# Altium footprint library TUNA_AL-CAP_Lib.PcbLib: 133 footprints (part 4 of 9)
Each footprint in its own frame and in the unit in brackets; x right, y up, seen from the top. Pads: shape width x height; smd on the part's side, far side on the other; paste and mask are expansions set on the pad; w line width, h text height; cw(c..) or ccw(c..) is an arc to the next point about the centre after c.
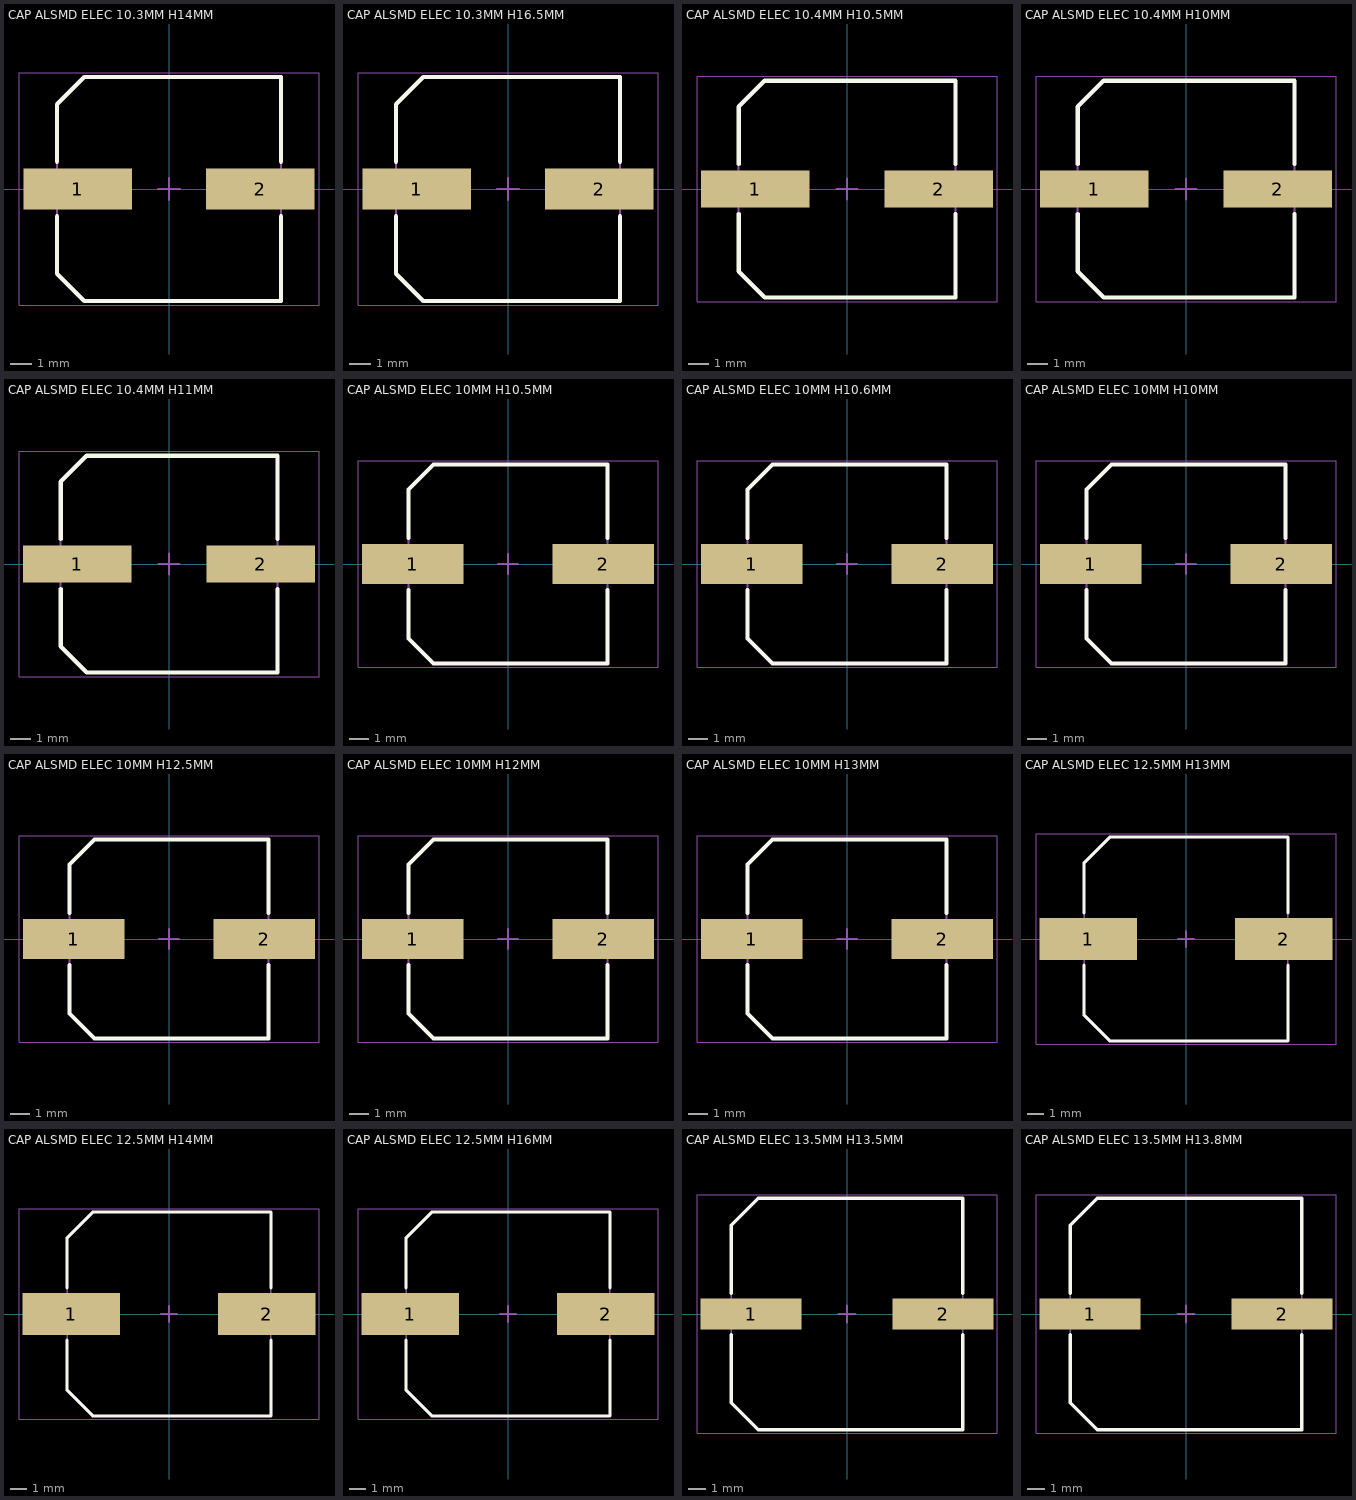
[diagram p3: the footprints below, top view; thin cyan lines are the x and y axes]

## CAP ALSMD ELEC 10.3MM H14MM [mm] "Aluminum SMD Electrolytic Capacitor, 10.30mm Land Size, 10.00mm Diameter, 14.00mm Height, 10.90mm Maximum Leads Span"
height 0.95
pads (2):
  rect 5x1.9 smd: 1(-4.2,0) 2(4.2,0)
Top Overlay:
  lines w0.2: -5.15,-1.25 -5.15,-3.9 -3.9,-5.15 5.15,-5.15 5.15,-1.25 ; -5.15,1.25 -5.15,3.9 -3.9,5.15 5.15,5.15 5.15,1.25
Mechanical 13:
  lines w0.1: -5.15,-3.9 -3.9,-5.15 5.15,-5.15 5.15,5.15 -3.9,5.15 -5.15,3.9 -5.15,-3.9
Mechanical 15:
  lines w0.05: -6.9,-5.35 6.9,-5.35 6.9,5.35 -6.9,5.35 -6.9,-5.35
  lines w0.1: -0.5,0 0.5,0 ; 0,-0.5 0,0.5
3D body ".STEP": height 14, standoff 0, extent -5.45,-5.15 5.45,5.15

## CAP ALSMD ELEC 10.3MM H16.5MM [mm] "Aluminum SMD Electrolytic Capacitor, 10.30mm Land Size, 10.00mm Diameter, 16.50mm Height, 10.90mm Maximum Leads Span"
height 0.95
pads (2):
  rect 5x1.9 smd: 1(-4.2,0) 2(4.2,0)
Top Overlay:
  lines w0.2: -5.15,-1.25 -5.15,-3.9 -3.9,-5.15 5.15,-5.15 5.15,-1.25 ; -5.15,1.25 -5.15,3.9 -3.9,5.15 5.15,5.15 5.15,1.25
Mechanical 13:
  lines w0.1: -5.15,-3.9 -5.15,3.9 -3.9,5.15 5.15,5.15 5.15,-5.15 -3.9,-5.15 -5.15,-3.9
Mechanical 15:
  lines w0.05: -6.9,-5.35 -6.9,5.35 6.9,5.35 6.9,-5.35 -6.9,-5.35
  lines w0.1: -0.5,0 0.5,0 ; 0,-0.5 0,0.5
3D body ".STEP": height 16.5, standoff 0, extent -5.45,-5.15 5.45,5.15

## CAP ALSMD ELEC 10.4MM H10.5MM [mm] "Aluminum SMD Electrolytic Capacitor, 10.40mm Land Size, 10.00mm Diameter, 10.50mm Height, 11.30mm Maximum Leads Span"
height 0.9
pads (2):
  rect 5.2x1.8 smd: 1(-4.4,0) 2(4.4,0)
Top Overlay:
  lines w0.2: -5.2,-1.2 -5.2,-3.95 -3.95,-5.2 5.2,-5.2 5.2,-1.2 ; -5.2,1.2 -5.2,3.95 -3.95,5.2 5.2,5.2 5.2,1.2
Mechanical 13:
  lines w0.1: -5.2,-3.95 -3.95,-5.2 5.2,-5.2 5.2,5.2 -3.95,5.2 -5.2,3.95 -5.2,-3.95
Mechanical 15:
  lines w0.05: -7.2,-5.4 7.2,-5.4 7.2,5.4 -7.2,5.4 -7.2,-5.4
  lines w0.1: -0.5,0 0.5,0 ; 0,-0.5 0,0.5
3D body ".STEP": height 10.5, standoff 0, extent -5.65,-5.2 5.65,5.2

## CAP ALSMD ELEC 10.4MM H10MM [mm] "Aluminum SMD Electrolytic Capacitor, 10.40mm Land Size, 10.00mm Diameter, 10.00mm Height, 11.30mm Maximum Leads Span"
height 0.9
pads (2):
  rect 5.2x1.8 smd: 1(-4.4,0) 2(4.4,0)
Top Overlay:
  lines w0.2: -5.2,-1.2 -5.2,-3.95 -3.95,-5.2 5.2,-5.2 5.2,-1.2 ; -5.2,1.2 -5.2,3.95 -3.95,5.2 5.2,5.2 5.2,1.2
Mechanical 13:
  lines w0.1: -5.2,-3.95 -3.95,-5.2 5.2,-5.2 5.2,5.2 -3.95,5.2 -5.2,3.95 -5.2,-3.95
Mechanical 15:
  lines w0.05: -7.2,-5.4 7.2,-5.4 7.2,5.4 -7.2,5.4 -7.2,-5.4
  lines w0.1: -0.5,0 0.5,0 ; 0,-0.5 0,0.5
3D body ".STEP": height 10, standoff 0, extent -5.65,-5.2 5.65,5.2

## CAP ALSMD ELEC 10.4MM H11MM [mm] "Aluminum SMD Electrolytic Capacitor, 10.40mm Land Size, 10.00mm Diameter, 11.00mm Height, 11.30mm Maximum Leads Span"
height 0.9
pads (2):
  rect 5.2x1.8 smd: 1(-4.4,0) 2(4.4,0)
Top Overlay:
  lines w0.2: -5.2,-1.2 -5.2,-3.95 -3.95,-5.2 5.2,-5.2 5.2,-1.2 ; -5.2,1.2 -5.2,3.95 -3.95,5.2 5.2,5.2 5.2,1.2
Mechanical 13:
  lines w0.1: -5.2,-3.95 -3.95,-5.2 5.2,-5.2 5.2,5.2 -3.95,5.2 -5.2,3.95 -5.2,-3.95
Mechanical 15:
  lines w0.05: -7.2,-5.4 7.2,-5.4 7.2,5.4 -7.2,5.4 -7.2,-5.4
  lines w0.1: -0.5,0 0.5,0 ; 0,-0.5 0,0.5
3D body ".STEP": height 11, standoff 0, extent -5.65,-5.2 5.65,5.2

## CAP ALSMD ELEC 10MM H10.5MM [mm] "Aluminum SMD Electrolytic Capacitor, 10.00mm Land Size, 10.00mm Diameter, 10.50mm Height, 12.10mm Maximum Leads Span"
height 1
pads (2):
  rect 5.1x2 smd: 1(-4.8,0) 2(4.8,0)
Top Overlay:
  lines w0.2: -5,-1.3 -5,-3.75 -3.75,-5 5,-5 5,-1.3 ; -5,1.3 -5,3.75 -3.75,5 5,5 5,1.3
Mechanical 13:
  lines w0.1: -5,-3.75 -3.75,-5 5,-5 5,5 -3.75,5 -5,3.75 -5,-3.75
Mechanical 15:
  lines w0.05: -7.55,-5.2 7.55,-5.2 7.55,5.2 -7.55,5.2 -7.55,-5.2
  lines w0.1: -0.5,0 0.5,0 ; 0,-0.5 0,0.5
3D body ".STEP": height 10.5, standoff 0, extent -6.05,-5 6.05,5

## CAP ALSMD ELEC 10MM H10.6MM [mm] "Aluminum SMD Electrolytic Capacitor, 10.00mm Land Size, 10.00mm Diameter, 10.60mm Height, 12.10mm Maximum Leads Span"
height 1
pads (2):
  rect 5.1x2 smd: 1(-4.8,0) 2(4.8,0)
Top Overlay:
  lines w0.2: -5,-1.3 -5,-3.75 -3.75,-5 5,-5 5,-1.3 ; -5,1.3 -5,3.75 -3.75,5 5,5 5,1.3
Mechanical 13:
  lines w0.1: -5,-3.75 -3.75,-5 5,-5 5,5 -3.75,5 -5,3.75 -5,-3.75
Mechanical 15:
  lines w0.05: -7.55,-5.2 7.55,-5.2 7.55,5.2 -7.55,5.2 -7.55,-5.2
  lines w0.1: -0.5,0 0.5,0 ; 0,-0.5 0,0.5
3D body ".STEP": height 10.6, standoff 0, extent -6.05,-5 6.05,5

## CAP ALSMD ELEC 10MM H10MM [mm] "Aluminum SMD Electrolytic Capacitor, 10.00mm Land Size, 10.00mm Diameter, 10.00mm Height, 12.10mm Maximum Leads Span"
height 1
pads (2):
  rect 5.1x2 smd: 1(-4.8,0) 2(4.8,0)
Top Overlay:
  lines w0.2: -5,-1.3 -5,-3.75 -3.75,-5 5,-5 5,-1.3 ; -5,1.3 -5,3.75 -3.75,5 5,5 5,1.3
Mechanical 13:
  lines w0.1: -5,-3.75 -5,3.75 -3.75,5 5,5 5,-5 -3.75,-5 -5,-3.75
Mechanical 15:
  lines w0.05: -7.55,-5.2 -7.55,5.2 7.55,5.2 7.55,-5.2 -7.55,-5.2
  lines w0.1: -0.5,0 0.5,0 ; 0,-0.5 0,0.5
3D body ".STEP": height 10, standoff 0, extent -6.05,-5 6.05,5

## CAP ALSMD ELEC 10MM H12.5MM [mm] "Aluminum SMD Electrolytic Capacitor, 10.00mm Land Size, 10.00mm Diameter, 12.50mm Height, 12.10mm Maximum Leads Span"
height 1
pads (2):
  rect 5.1x2 smd: 1(-4.8,0) 2(4.8,0)
Top Overlay:
  lines w0.2: -5,-1.3 -5,-3.75 -3.75,-5 5,-5 5,-1.3 ; -5,1.3 -5,3.75 -3.75,5 5,5 5,1.3
Mechanical 13:
  lines w0.1: -5,-3.75 -3.75,-5 5,-5 5,5 -3.75,5 -5,3.75 -5,-3.75
Mechanical 15:
  lines w0.05: -7.55,-5.2 7.55,-5.2 7.55,5.2 -7.55,5.2 -7.55,-5.2
  lines w0.1: -0.5,0 0.5,0 ; 0,-0.5 0,0.5
3D body ".STEP": height 12.5, standoff 0, extent -6.05,-5 6.05,5

## CAP ALSMD ELEC 10MM H12MM [mm] "Aluminum SMD Electrolytic Capacitor, 10.00mm Land Size, 10.00mm Diameter, 12.00mm Height, 12.10mm Maximum Leads Span"
height 1
pads (2):
  rect 5.1x2 smd: 1(-4.8,0) 2(4.8,0)
Top Overlay:
  lines w0.2: -5,-1.3 -5,-3.75 -3.75,-5 5,-5 5,-1.3 ; -5,1.3 -5,3.75 -3.75,5 5,5 5,1.3
Mechanical 13:
  lines w0.1: -5,-3.75 -3.75,-5 5,-5 5,5 -3.75,5 -5,3.75 -5,-3.75
Mechanical 15:
  lines w0.05: -7.55,-5.2 7.55,-5.2 7.55,5.2 -7.55,5.2 -7.55,-5.2
  lines w0.1: -0.5,0 0.5,0 ; 0,-0.5 0,0.5
3D body ".STEP": height 12, standoff 0, extent -6.05,-5 6.05,5

## CAP ALSMD ELEC 10MM H13MM [mm] "Aluminum SMD Electrolytic Capacitor, 10.00mm Land Size, 10.00mm Diameter, 13.00mm Height, 12.10mm Maximum Leads Span"
height 1
pads (2):
  rect 5.1x2 smd: 1(-4.8,0) 2(4.8,0)
Top Overlay:
  lines w0.2: -5,-1.3 -5,-3.75 -3.75,-5 5,-5 5,-1.3 ; -5,1.3 -5,3.75 -3.75,5 5,5 5,1.3
Mechanical 13:
  lines w0.1: -5,-3.75 -5,3.75 -3.75,5 5,5 5,-5 -3.75,-5 -5,-3.75
Mechanical 15:
  lines w0.05: -7.55,-5.2 -7.55,5.2 7.55,5.2 7.55,-5.2 -7.55,-5.2
  lines w0.1: -0.5,0 0.5,0 ; 0,-0.5 0,0.5
3D body ".STEP": height 13, standoff 0, extent -6.05,-5 6.05,5

## CAP ALSMD ELEC 12.5MM H13MM [mm] "Aluminum SMD Electrolytic Capacitor, 12.50mm Land Size, 12.50mm Diameter, 13.00mm Height, 14.90mm Maximum Leads Span"
height 1.3
pads (2):
  rect 6x2.6 smd: 1(-6,0) 2(6,0)
Top Overlay:
  lines w0.2: -6.25,-1.6 -6.25,-4.687 -4.687,-6.25 6.25,-6.25 6.25,-1.6 ; -6.25,1.6 -6.25,4.687 -4.687,6.25 6.25,6.25 6.25,1.6
Mechanical 13:
  lines w0.1: -6.25,-4.687 -4.687,-6.25 6.25,-6.25 6.25,6.25 -4.687,6.25 -6.25,4.687 -6.25,-4.687
Mechanical 15:
  lines w0.05: -9.2,-6.45 9.2,-6.45 9.2,6.45 -9.2,6.45 -9.2,-6.45
  lines w0.1: -0.5,0 0.5,0 ; 0,-0.5 0,0.5
3D body ".STEP": height 13, standoff 0, extent -7.45,-6.25 7.45,6.25

## CAP ALSMD ELEC 12.5MM H14MM [mm] "Aluminum SMD Electrolytic Capacitor, 12.50mm Land Size, 12.50mm Diameter, 14.00mm Height, 14.90mm Maximum Leads Span"
height 1.3
pads (2):
  rect 6x2.6 smd: 1(-6,0) 2(6,0)
Top Overlay:
  lines w0.2: -6.25,-1.6 -6.25,-4.687 -4.687,-6.25 6.25,-6.25 6.25,-1.6 ; -6.25,1.6 -6.25,4.687 -4.687,6.25 6.25,6.25 6.25,1.6
Mechanical 13:
  lines w0.1: -6.25,-4.687 -4.687,-6.25 6.25,-6.25 6.25,6.25 -4.687,6.25 -6.25,4.687 -6.25,-4.687
Mechanical 15:
  lines w0.05: -9.2,-6.45 9.2,-6.45 9.2,6.45 -9.2,6.45 -9.2,-6.45
  lines w0.1: -0.5,0 0.5,0 ; 0,-0.5 0,0.5
3D body ".STEP": height 14, standoff 0, extent -7.45,-6.25 7.45,6.25

## CAP ALSMD ELEC 12.5MM H16MM [mm] "Aluminum SMD Electrolytic Capacitor, 12.50mm Land Size, 12.50mm Diameter, 16.00mm Height, 14.90mm Maximum Leads Span"
height 1.3
pads (2):
  rect 6x2.6 smd: 1(-6,0) 2(6,0)
Top Overlay:
  lines w0.2: -6.25,-1.6 -6.25,-4.687 -4.687,-6.25 6.25,-6.25 6.25,-1.6 ; -6.25,1.6 -6.25,4.687 -4.687,6.25 6.25,6.25 6.25,1.6
Mechanical 13:
  lines w0.1: -6.25,-4.687 -6.25,4.687 -4.687,6.25 6.25,6.25 6.25,-6.25 -4.687,-6.25 -6.25,-4.687
Mechanical 15:
  lines w0.05: -9.2,-6.45 -9.2,6.45 9.2,6.45 9.2,-6.45 -9.2,-6.45
  lines w0.1: -0.5,0 0.5,0 ; 0,-0.5 0,0.5
3D body ".STEP": height 16, standoff 0, extent -7.45,-6.25 7.45,6.25

## CAP ALSMD ELEC 13.5MM H13.5MM [mm] "Aluminum SMD Electrolytic Capacitor, 13.50mm Land Size, 12.50mm Diameter, 13.50mm Height, 13.80mm Maximum Leads Span"
height 0.9
pads (2):
  rect 5.9x1.8 smd: 1(-5.6,0) 2(5.6,0)
Top Overlay:
  lines w0.2: -6.75,-1.2 -6.75,-5.187 -5.187,-6.75 6.75,-6.75 6.75,-1.2 ; -6.75,1.2 -6.75,5.187 -5.187,6.75 6.75,6.75 6.75,1.2
Mechanical 13:
  lines w0.1: -6.75,-5.187 -5.187,-6.75 6.75,-6.75 6.75,6.75 -5.187,6.75 -6.75,5.187 -6.75,-5.187
Mechanical 15:
  lines w0.05: -8.75,-6.95 8.75,-6.95 8.75,6.95 -8.75,6.95 -8.75,-6.95
  lines w0.1: -0.5,0 0.5,0 ; 0,-0.5 0,0.5
3D body ".STEP": height 13.5, standoff 0, extent -6.9,-6.75 6.9,6.75

## CAP ALSMD ELEC 13.5MM H13.8MM [mm] "Aluminum SMD Electrolytic Capacitor, 13.50mm Land Size, 12.50mm Diameter, 13.80mm Height, 13.80mm Maximum Leads Span"
height 0.9
pads (2):
  rect 5.9x1.8 smd: 1(-5.6,0) 2(5.6,0)
Top Overlay:
  lines w0.2: -6.75,-1.2 -6.75,-5.187 -5.187,-6.75 6.75,-6.75 6.75,-1.2 ; -6.75,1.2 -6.75,5.187 -5.187,6.75 6.75,6.75 6.75,1.2
Mechanical 13:
  lines w0.1: -6.75,-5.187 -5.187,-6.75 6.75,-6.75 6.75,6.75 -5.187,6.75 -6.75,5.187 -6.75,-5.187
Mechanical 15:
  lines w0.05: -8.75,-6.95 8.75,-6.95 8.75,6.95 -8.75,6.95 -8.75,-6.95
  lines w0.1: -0.5,0 0.5,0 ; 0,-0.5 0,0.5
3D body ".STEP": height 13.8, standoff 0, extent -6.9,-6.75 6.9,6.75